# Altium footprint library ref-packages.PCBLIB: 1544 footprints (part 95 of 103)
Each footprint in its own frame and in the unit in brackets; x right, y up, seen from the top. Pads: shape width x height; smd on the part's side, far side on the other; paste and mask are expansions set on the pad; w line width, h text height; cw(c..) or ccw(c..) is an arc to the next point about the centre after c.
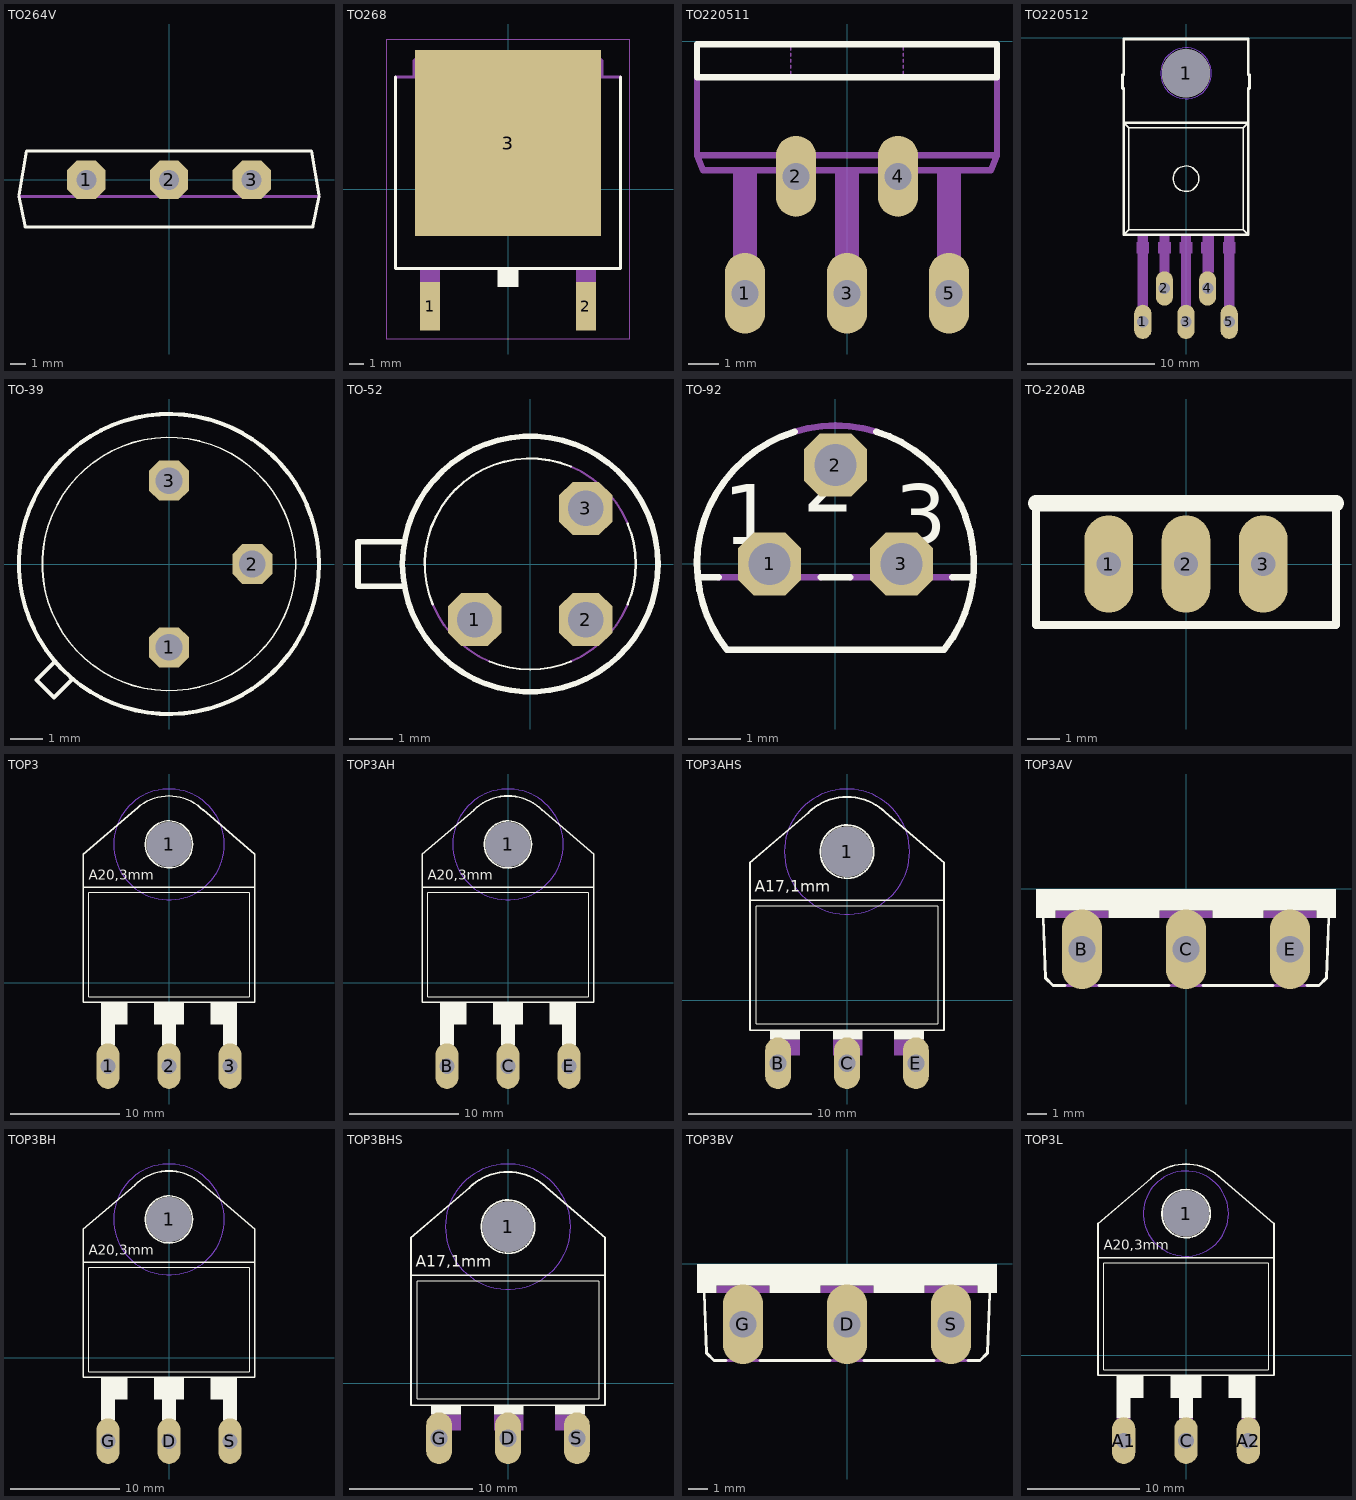
[diagram p94: the footprints below, top view; thin cyan lines are the x and y axes]

## TO264V [mil]
pads (3):
  oct 100x100 hole 51.18: 1(-214.57,0) 2(0,0) 3(214.57,0)
Top Overlay:
  lines w7.87: -389.76,-43.31 -374.02,-118.11 -374.02,-122.05 374.02,-122.05 374.02,-118.11 389.76,-43.31 ; -389.76,-39.37 -370.08,74.8 370.08,74.8 389.76,-39.37
Mechanical 16:
  lines w7.87: -389.76,-43.31 389.76,-43.31

## TO268 [mil]
pads (3):
  rect 55.12x133.86 smd: 1(-214.57,-322.83) 2(214.57,-322.83)
  rect 511.81x511.81 smd: 3(0,125.98)
Top Overlay:
  rectangle: -28.35,-269.69 28.35,-218.5
  lines w8: -309.33,308.46 -309.33,-218.46 309.33,-218.46 309.33,308.46
Top Solder:
  rectangle: -275.59,-145.67 275.59,397.64
Mechanical 16:
  rectangle: -242.13,-375.98 -187.01,-269.69
  rectangle: -242.13,-269.69 -187.01,-218.5
  rectangle: 187.01,-269.69 242.13,-218.5
  rectangle: 187.01,-375.98 242.13,-269.69
  region: 0,0 10,0 10,10 0,10
  lines w8: -309.37,308.46 309.37,308.46 ; -258.48,312.48 -258.48,353.48 -240.48,371.48 240.47,371.5 258.46,353.46 258.46,312.48 -258.48,312.48
Mechanical 27:
  lines w2: -333.58,-412.72 333.58,-412.72 333.58,412.72 -333.58,412.72 -333.58,-412.72

## TO220511 [mil]
pads (5):
  oval 53.15x106.29 hole 35.43: 1(-133.86,-330.71) 2(-66.93,-177.17) 3(0,-330.71) 4(66.93,-177.17) 5(133.86,-330.71)
Top Overlay:
  lines w8: -196.85,-47.24 -196.85,-3.94 196.85,-3.94 196.85,-47.24 -196.85,-47.24
Mechanical 16:
  rectangle: -149.61,-334.65 -118.11,-291.34
  rectangle: -15.75,-334.65 15.75,-291.34
  rectangle: 118.11,-334.65 149.61,-291.34
  rectangle: -149.61,-291.34 -118.11,-173.23
  rectangle: -15.75,-291.34 15.75,-173.23
  rectangle: 118.11,-291.34 149.61,-173.23
  rectangle: -82.68,-181.1 -51.18,-173.23
  rectangle: 51.18,-181.1 82.68,-173.23
  lines w2: -73.62,-46.06 -73.62,-39.37 ; -73.62,-35.43 -73.62,-31.5 ; -73.62,-27.56 -73.62,-23.62 ; -73.62,-19.69 -73.62,-15.75 ; -73.62,-11.81 -73.62,-7.87 ; 73.62,-46.06 73.62,-39.37 ; 73.62,-35.43 73.62,-31.5 ; 73.62,-27.56 73.62,-23.62 ; 73.62,-19.69 73.62,-15.75 ; 73.62,-11.81 73.62,-7.87
  lines w8: -196.85,-47.24 -196.85,-149.61 ; 196.85,-47.24 196.85,-149.61 ; -196.85,-149.61 -188.98,-169.29 188.98,-169.29 196.85,-149.61 ; -196.85,-149.61 196.85,-149.61

## TO220512 [mil]
pads (6):
  oval 53.15x106.29 hole 35.43: 1(-133.86,-880.71) 2(-66.93,-777.17) 3(0,-880.71) 4(66.93,-777.17) 5(133.86,-880.71)
  round 149.61 hole 149.61: 1(0,-110.24)
Top Layer keep-out:
  circle w0: c0,-110.24 r78.74
Bottom Layer keep-out:
  circle w0: c0,-110.24 r78.74
Top Overlay:
  circle w4: c0,-437.01 r39.56
  lines w4: -192.91,-610.24 -177.17,-594.49 ; -188.98,-267.72 -177.17,-279.53 ; 188.98,-267.72 177.17,-279.53 ; 192.91,-610.24 177.17,-594.49 ; -177.17,-594.49 177.17,-594.49 ; -177.17,-594.49 -177.17,-279.53 ; -177.17,-279.53 177.17,-279.53 ; 177.17,-594.49 177.17,-279.53
  lines w8: -196.85,-157.48 -196.85,-114.17 ; -192.91,-157.48 -192.91,-263.78 ; -192.91,-114.17 -192.91,-3.94 192.91,-3.94 192.91,-114.17 ; 192.91,-157.48 192.91,-263.78 ; 196.85,-157.48 196.85,-114.17 ; -192.91,-263.78 -192.91,-610.24 192.91,-610.24 192.91,-263.78 ; -192.91,-263.78 192.91,-263.78
Mechanical 16:
  rectangle: -149.61,-876.77 -118.11,-829.53
  rectangle: -82.68,-774.41 -51.18,-727.17
  rectangle: -15.75,-876.77 15.75,-829.53
  rectangle: 51.18,-774.41 82.68,-727.17
  rectangle: 118.11,-876.77 149.61,-829.53
  rectangle: -153.54,-669.29 -114.17,-633.86
  rectangle: -86.61,-669.29 -47.24,-633.86
  rectangle: -19.69,-669.29 19.69,-633.86
  rectangle: 47.24,-669.29 86.61,-633.86
  rectangle: 114.17,-669.29 153.54,-633.86
  rectangle: -149.61,-830.71 -118.11,-614.17
  rectangle: -82.68,-728.35 -51.18,-614.17
  rectangle: -15.75,-830.71 15.75,-614.17
  rectangle: 51.18,-728.35 86.61,-614.17
  rectangle: 118.11,-830.71 149.61,-614.17
Via Holes:
  circle w0: c0,-110.24 r106.3

## TO-39 [mil]
pads (3):
  oct 48x48 hole 32: 1(0,-100) 2(100,0) 3(0,100)
Top Overlay:
  circle w5: c0,0 r180
  circle w2: c0,0 r152
  lines w5: -138,-118 -159,-139 -138,-160 -117,-139

## TO-52 [mil]
pads (3):
  oct 48x48 hole 32: 1(-50,-50) 2(50,-50) 3(50,50)
Top Overlay:
  circle w5: c0,0 r115
  lines w2: -87.68,-36.57 cw(c0,0) 36.57,87.68 ; -36.57,-87.68 ccw(c0,0) 36.57,-87.68 ; 87.68,-36.57 ccw(c0,0) 87.68,36.57
  lines w5: -113.25,-20 -155,-20 -155,20 -113.25,20
Mechanical 16:
  lines w2: -87.68,-36.57 ccw(c0,0) -36.57,-87.68 ; 36.57,-87.68 ccw(c0,0) 87.68,-36.57 ; 36.57,87.68 cw(c0,0) 87.68,36.57
  text "1" at -75,-50 h77.5
  text "2" at 25,-50 h77.5
  text "3" at 0,25 h77.5

## TO-92 [mil]
pads (3):
  oct 48x48 hole 32: 1(-50,0) 2(0,75) 3(50,0)
Top Overlay:
  lines w5: -88.73,-10 -104.52,-10 ; -30.96,100.33 ccw(c0,0) -104.52,-10 ; -11.27,-10 11.27,-10 ; 30.96,100.33 cw(c0,0) 82.46,-65 -82.46,-65 cw(c0,0) -104.52,-10 ; 88.73,-10 104.52,-10
  text "2" at -25,25 h77.5
  text "1" at -85,0 h77.5
  text "3" at 45,0 h77.5
Mechanical 16:
  lines w5: -88.73,-10 -11.27,-10 ; -30.96,100.33 cw(c0,-0.02) 30.96,100.33 ; 11.27,-10 88.73,-10

## TO-220AB [mil]
pads (3):
  oval 60x120 hole 30: 1(-95.28,0) 2(0,0) 3(95.28,0)
Top Overlay:
  lines w10: -185,75 -185,-75 185,-75 185,75
  lines w20: -185,75 185,75

## TOP3 [mil]
pads (4):
  oval 82.5x165 hole 55: 1(-220,-300) 2(0,-300) 3(220,-300)
  round 162 hole 162: 1(0,500)
Bottom Layer keep-out:
  circle w0: c0,500 r200
Top Overlay:
  circle w5: c0,500 r85
  rectangle: -245,-150 -150,-70
  rectangle: -55,-150 55,-70
  rectangle: 150,-150 245,-70
  rectangle: -245,-225 -195,-150
  rectangle: -25,-225 25,-150
  rectangle: 195,-225 245,-150
  lines w2: -290,-50 290,-50 290,325 -290,325 -290,-50
  lines w5: -123.74,623.74 cw(c0.01,500) 0,675 cw(c-0.01,500) 123.74,623.74 ; -123,624 -310,465 -310,345 ; 123,625 310,465 310,345 ; -310,345 -310,-70 310,-70 310,345 ; -310,345 310,345
  text "A20,3mm" at -290,360 h60.45
Mechanical 16:
  rectangle: -245,-300 -195,-225
  rectangle: -25,-300 25,-225
  rectangle: 195,-300 245,-225
  text "1" at -225,-25 h77.5
  text "2" at -25,-25 h77.5
  text "3" at 175,-25 h77.5
Via Holes:
  circle w0: c0,500 r200

## TOP3AH [mil]
pads (4):
  round 162 hole 162: 1(0,500)
  oval 82.5x165 hole 55: B(-220,-300) C(0,-300) E(220,-300)
Bottom Layer keep-out:
  circle w0: c0,500 r200
Top Overlay:
  circle w6: c0,500 r85
  rectangle: -245,-150 -150,-70
  rectangle: -55,-150 55,-70
  rectangle: 150,-150 245,-70
  rectangle: -245,-225 -195,-150
  rectangle: -25,-225 25,-150
  rectangle: 195,-225 245,-150
  lines w2: -290,-50 290,-50 290,325 -290,325 -290,-50
  lines w6: -123.74,623.74 cw(c0.01,500) 0,675 cw(c-0.01,500) 123.74,623.74 ; -123,624 -310,465 -310,345 ; 123,625 310,465 310,345 ; -310,345 -310,-70 310,-70 310,345 ; -310,345 310,345
  text "A20,3mm" at -290,360 h62
Mechanical 16:
  rectangle: -245,-300 -195,-225
  rectangle: -25,-300 25,-225
  rectangle: 195,-300 245,-225
Via Holes:
  circle w0: c0,500 r200

## TOP3AHS [mil]
pads (4):
  round 162 hole 162: 1(0,475)
  oval 82.5x165 hole 55: B(-220,-200) C(0,-200) E(220,-200)
Bottom Layer keep-out:
  circle w0: c0,475 r200
Top Overlay:
  circle w6: c0,475 r85
  rectangle: -245,-125 -150,-95
  rectangle: -45,-125 50,-95
  rectangle: 150,-125 245,-95
  lines w2: -290,-75 290,-75 290,300 -290,300 -290,-75
  lines w6: -123.74,598.74 cw(c0.01,475) 0,650 cw(c-0.01,475) 123.74,598.74 ; -123,599 -310,440 -310,320 ; 123,600 310,440 310,320 ; -310,320 -310,-95 310,-95 310,320 ; -310,320 310,320
  text "A17,1mm" at -295,335 h62
Mechanical 16:
  rectangle: -245,-200 -195,-165
  rectangle: -25,-200 25,-165
  rectangle: 195,-200 245,-165
  rectangle: -245,-175 -150,-125
  rectangle: -45,-175 50,-125
  rectangle: 150,-175 245,-125
Via Holes:
  circle w0: c0,475 r200

## TOP3AV [mil]
pads (3):
  oval 82.5x165 hole 55: B(-215,-125) C(0,-125) E(215,-125)
Top Overlay:
  rectangle: -310,-45 310,0
  rectangle: -310,-60 -270,-45
  rectangle: -160,-60 -55,-45
  rectangle: 55,-60 160,-45
  rectangle: 270,-60 310,-45
  lines w6: -295,-60 -290,-185 -275,-200 -250,-200 ; -180,-200 -35,-200 ; 35,-200 180,-200 ; 250,-200 275,-200 290,-185 295,-60
Mechanical 16:
  rectangle: -270,-60 -160,-45
  rectangle: -55,-60 55,-45
  rectangle: 160,-60 270,-45
  lines w6: -250,-200 -180,-200 ; -35,-200 35,-200 ; 180,-200 250,-200

## TOP3BH [mil]
pads (4):
  round 162 hole 162: 1(0,500)
  oval 82.5x165 hole 55: D(0,-300) G(-220,-300) S(220,-300)
Bottom Layer keep-out:
  circle w0: c0,500 r200
Top Overlay:
  circle w6: c0,500 r85
  rectangle: -245,-150 -150,-70
  rectangle: -55,-150 55,-70
  rectangle: 150,-150 245,-70
  rectangle: -245,-225 -195,-150
  rectangle: -25,-225 25,-150
  rectangle: 195,-225 245,-150
  lines w2: -290,-50 290,-50 290,325 -290,325 -290,-50
  lines w6: -123.74,623.74 cw(c0.01,500) 0,675 cw(c-0.01,500) 123.74,623.74 ; -123,624 -310,465 -310,345 ; 123,625 310,465 310,345 ; -310,345 -310,-70 310,-70 310,345 ; -310,345 310,345
  text "A20,3mm" at -290,360 h62
Mechanical 16:
  rectangle: -245,-300 -195,-225
  rectangle: -25,-300 25,-225
  rectangle: 195,-300 245,-225
Via Holes:
  circle w0: c0,500 r200

## TOP3BHS [mil]
pads (4):
  round 162 hole 162: 1(0,500)
  oval 82.5x165 hole 55: D(0,-175) G(-220,-175) S(220,-175)
Bottom Layer keep-out:
  circle w0: c0,500 r200
Top Overlay:
  circle w6: c0,500 r85
  rectangle: -245,-100 -150,-70
  rectangle: -45,-100 50,-70
  rectangle: 150,-100 245,-70
  lines w2: -290,-50 290,-50 290,325 -290,325 -290,-50
  lines w6: -123.74,623.74 cw(c0.01,500) 0,675 cw(c-0.01,500) 123.74,623.74 ; -123,624 -310,465 -310,345 ; 123,625 310,465 310,345 ; -310,345 -310,-70 310,-70 310,345 ; -310,345 310,345
  text "A17,1mm" at -295,360 h62
Mechanical 16:
  rectangle: -245,-175 -195,-140
  rectangle: -25,-175 25,-140
  rectangle: 195,-175 245,-140
  rectangle: -245,-150 -150,-100
  rectangle: -45,-150 50,-100
  rectangle: 150,-150 245,-100
Via Holes:
  circle w0: c0,500 r200

## TOP3BV [mil]
pads (3):
  oval 82.5x165 hole 55: D(0,-125) G(-215,-125) S(215,-125)
Top Overlay:
  rectangle: -310,-45 310,0
  rectangle: -310,-60 -270,-45
  rectangle: -160,-60 -55,-45
  rectangle: 55,-60 160,-45
  rectangle: 270,-60 310,-45
  lines w6: -295,-60 -290,-185 -275,-200 -250,-200 ; -180,-200 -35,-200 ; 35,-200 180,-200 ; 250,-200 275,-200 290,-185 295,-60
Mechanical 16:
  rectangle: -270,-60 -160,-45
  rectangle: -55,-60 55,-45
  rectangle: 160,-60 270,-45
  lines w6: -250,-200 -180,-200 ; -35,-200 35,-200 ; 180,-200 250,-200

## TOP3L [mil]
pads (4):
  round 162 hole 162: 1(0,500)
  oval 82.5x165 hole 55: A1(-220,-300) A2(220,-300) C(0,-300)
Bottom Layer keep-out:
  circle w0: c0,500 r150
Top Overlay:
  circle w6: c0,500 r85
  rectangle: -245,-150 -150,-70
  rectangle: -55,-150 55,-70
  rectangle: 150,-150 245,-70
  rectangle: 195,-220 245,-150
  rectangle: -25,-220 25,-150
  rectangle: -245,-220 -195,-150
  lines w2: -290,-50 290,-50 290,325 -290,325 -290,-50
  lines w6: -123.74,623.74 cw(c0.01,500) 0,675 cw(c-0.01,500) 123.74,623.74 ; -123,624 -310,465 -310,345 ; 123,625 310,465 310,345 ; -310,345 -310,-70 310,-70 310,345 ; -310,345 310,345
  text "A20,3mm" at -290,360 h60.45
Mechanical 16:
  rectangle: -245,-295 -195,-220
  rectangle: -25,-295 25,-220
  rectangle: 195,-295 245,-220
Via Holes:
  circle w0: c0,500 r150